# Altium footprint library Cty1.PcbLib: 1378 footprints (part 42 of 87)
Each footprint in its own frame and in the unit in brackets; x right, y up, seen from the top. Pads: shape width x height; smd on the part's side, far side on the other; paste and mask are expansions set on the pad; w line width, h text height; cw(c..) or ccw(c..) is an arc to the next point about the centre after c.
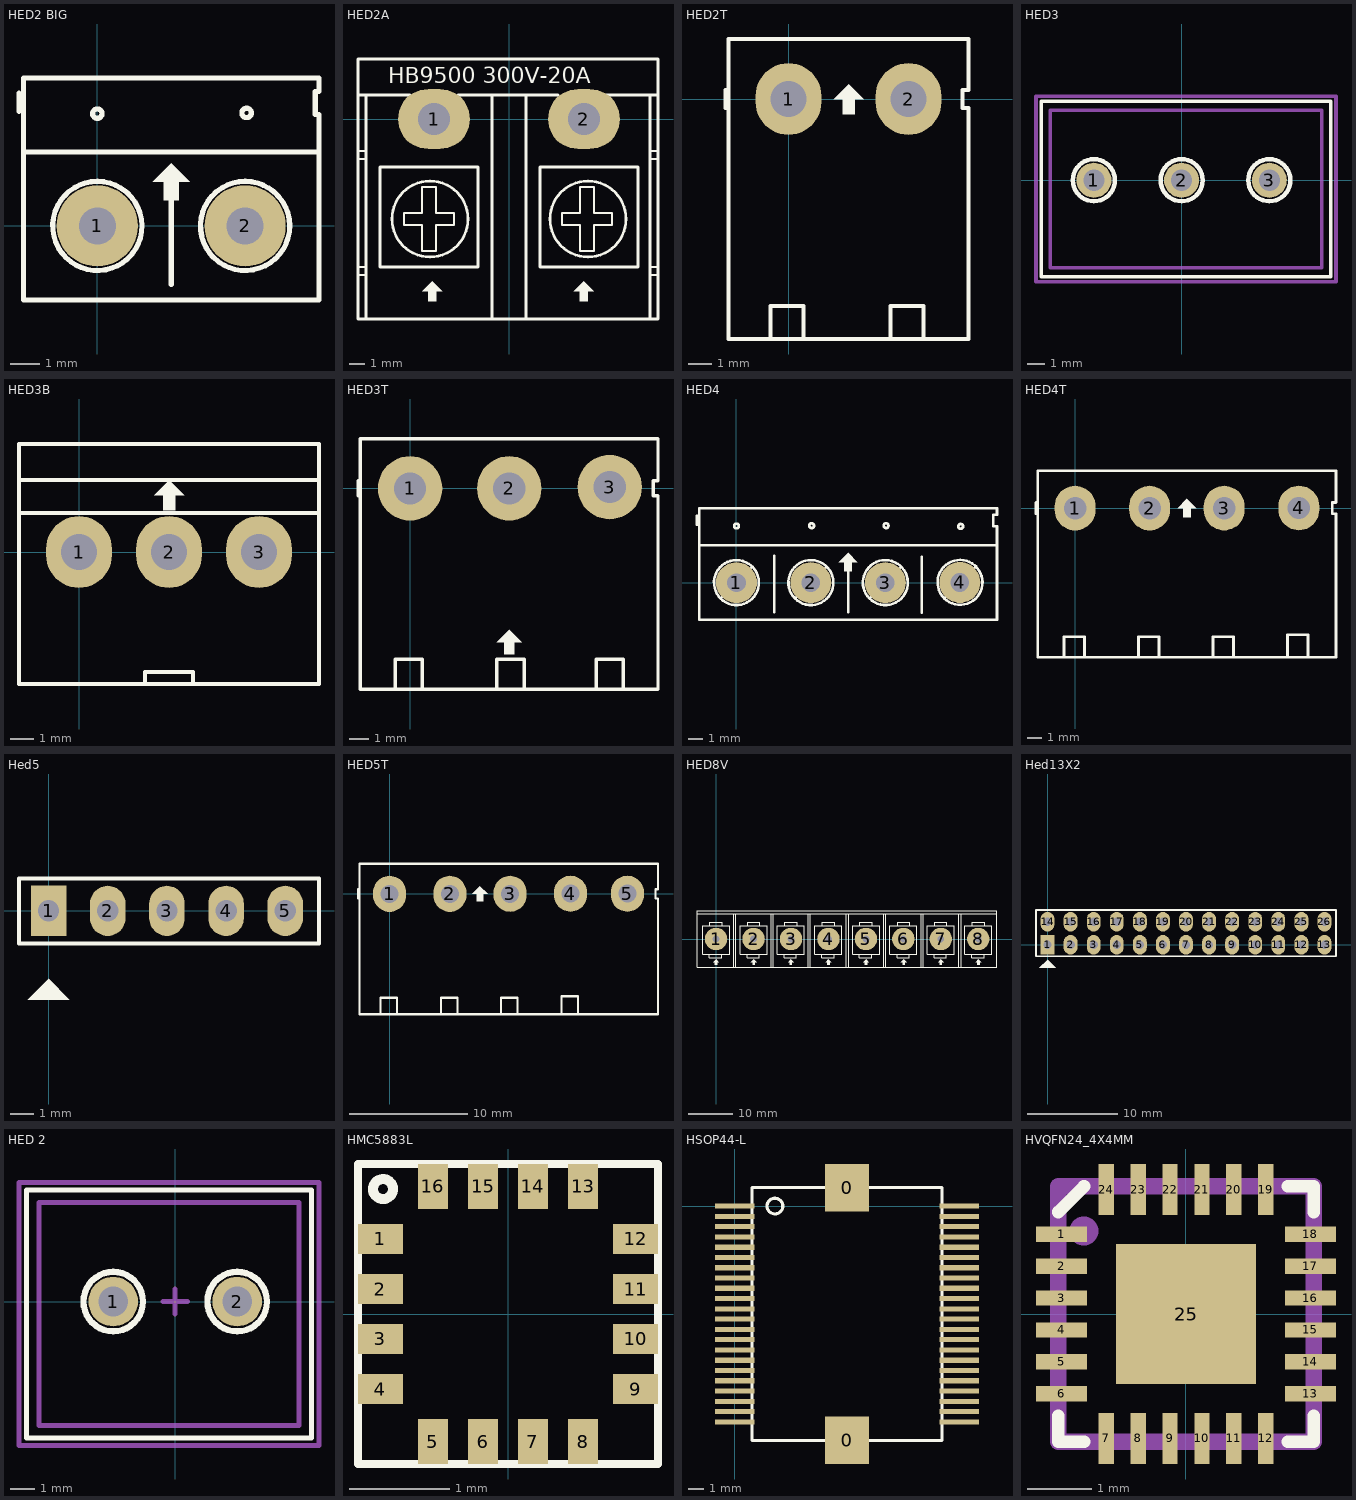
[diagram p41: the footprints below, top view; thin cyan lines are the x and y axes]

## HED2 BIG [mil] "Header 2, 2 pin, hight 300mil, Pin to Pin 200, Colour Green"
height 300
pads (2):
  round 110 hole 50: 1(0,0) 2(200,0)
Top Overlay:
  circle w7: c0,152 r6.4
  circle w7: c202,153 r6.4
  region: 100,85 75,60 90,60 90,35 110,35 110,60 125,60
  lines w7: -106,155 -106,180 ; -98,100 299,100 ; 38.83,46.23 ccw(c0,0) 40.11,45.12 ; 100,-79 100,72 ; 238.74,46.3 ccw(c200,0) 240.11,45.12 ; -100,-100 300,-100 300,151 295,151 295,182 300,182 300,200 -100,200 -100,50 -100,-100
3D body "SW3dPS-KRM2.STEP": height 393.7, standoff -157.48, extent -91.85,-140 301.85,155.28

## HED2A [mil] "Header 2: 300V-20A, 2 pin, hight 300mil, Pin to Pin 400, Colour Green"
height 300
pads (2):
  oval 180x150 hole 80: 1(-187.5,0) 2(187.5,0)
Top Overlay:
  circle w7: c197.5,-250 r95
  circle w7: c-197.5,-250 r95
  region: 187.5,-405 162.5,-430 177.5,-430 177.5,-455 197.5,-455 197.5,-430 212.5,-430
  region: -192.5,-405 -217.5,-430 -202.5,-430 -202.5,-455 -182.5,-455 -182.5,-430 -167.5,-430
  lines w5: -375,-390 -360,-390 ; -375,-370 -360,-370 ; -375,-100 -360,-100 ; -375,-80 -360,-80 ; 355,-390 370,-390 ; 355,-370 370,-370 ; 355,-100 370,-100 ; 355,-80 370,-80 ; -262.5,-265 -217.5,-265 -217.5,-330 -182.5,-330 -182.5,-265 -137.5,-265 -137.5,-235 -182.5,-235 -182.5,-170 -217.5,-170 -217.5,-235 -262.5,-235 -262.5,-265 ; 132.5,-265 132.5,-235 177.5,-235 177.5,-170 212.5,-170 212.5,-235 257.5,-235 257.5,-265 212.5,-265 212.5,-330 177.5,-330 177.5,-265 132.5,-265
  lines w7: -377.5,60 -247.5,60 ; -357.5,-495 -357.5,60 ; -127.5,60 122.5,60 ; -42.5,-495 -42.5,60 ; 42.5,-495 42.5,60 ; 242.5,60 372.5,60 ; 352.5,-495 352.5,60 ; -377.5,-500 372.5,-500 372.5,150 -377.5,150 -377.5,-500 ; -322.5,-370 -322.5,-120 -77.5,-120 -77.5,-370 -322.5,-370 ; 77.5,-370 322.5,-370 322.5,-120 77.5,-120 77.5,-370
  text "HB9500 300V-20A" at -302.5,90 h40

## HED2T [mil] "Header 2, 2 pin, hight 300mil, Pin to Pin 200, Colour Green"
height 300
pads (2):
  oval 110x120 hole 60: 1(0,0) 2(200,0)
Top Overlay:
  region: 100,25 75,0 90,0 90,-25 110,-25 110,0 125,0
  lines w7: -105,-15 -105,15 ; -100,100 -100,-400 300,-400 300,-15 290,-15 290,15 300,15 300,100 -98,100 ; -30,-400 -30,-345 25,-345 25,-400 ; 170,-400 170,-345 225,-345 225,-400
3D body "SW3dPS-5EHDR_2P.STEP": height 366.97, standoff -124.02, extent -96.7,-399.22 297,73.22

## HED3 [mm]
pads (3):
  round 2 hole 1.2 mask+0.01: 1(-5,0) 2(0,0) 3(5,0)
Top Overlay:
  circle w0.254: c-5,0 r1.2
  circle w0.254: c0,0 r1.2
  circle w0.254: c5,0 r1.2
  lines w0.2: -8,-5.5 8.5,-5.5 8.5,4.5 -8,4.5 -8,-5.5
Mechanical 13:
  lines w0.2: -7.5,-5 -7.5,4 8,4 8,-5 -7.5,-5
Mechanical 15:
  lines w0.2: -0.5,0 0.5,0 ; 0,-0.5 0,0.5 ; -8.3,-5.8 -8.3,4.8 8.8,4.8 8.8,-5.8 -8.3,-5.8
3D body "Klemmnik 300-031-12.STEP": height 12.5, standoff -4.5, extent -7.5,-5 8,4

## HED3B [mil] "Header 3, 3 pin, hight 300mil, Pin to Pin 150, Colour White"
height 300
pads (3):
  oval 110x120 hole 60: 1(0,0) 2(150,0) 3(300,0)
Top Overlay:
  region: 150,120 125,95 140,95 140,70 160,70 160,95 175,95
  lines w7: -100,65 400,65 ; -100,120 400,120 ; 110,-220 110,-200 190,-200 190,-220 ; -100,-220 400,-220 400,180 -100,180 -100,-220
3D body "User Library-1803280.STEP": height 285.43, standoff -133.86, extent -104.36,-221.14 400.36,145

## HED3T [mil] "Header 3, 3 pin, hight 300mil, Pin to Pin 200, Colour Green"
height 300
pads (3):
  round 130 hole 65: 1(0,0) 2(200,0) 3(402.62,2.62)
Top Overlay:
  region: 200,-285 175,-310 190,-310 190,-335 210,-335 210,-310 225,-310
  lines w7: -105,-15 -105,15 ; -30,-400 -30,-345 25,-345 25,-400 ; 175,-400 175,-345 230,-345 230,-400 ; 375,-400 375,-345 430,-345 430,-400 ; -100,-405 500,-405 500,-15 490,-15 490,15 500,15 500,100 -100,100 -100,-405
3D body "User Library-BigHeader 5EHDR_1P.step": height 90.55, standoff -400.44, extent -95,-404 101.85,68.44
3D body "User Library-BigHeader 5EHDR_1P.step": height 90.55, standoff -400.44, extent 102,-404 298.85,68.44
3D body "User Library-BigHeader 5EHDR_1P.step": height 90.55, standoff -400.44, extent 299,-404.22 495.85,68.22

## HED4 [mil] "Header 4, 4 pin, hight 300mil, Pin to Pin 200, Colour Green"
height 300
pads (4):
  round 110 hole 50: 1(0,0) 2(200,0) 3(400.06,0.06) 4(600.39,0.39)
Top Overlay:
  circle w7: c602.6,151 r6.4
  circle w7: c402,153 r6.4
  circle w7: c0,152 r6.4
  circle w7: c202,153 r6.4
  region: 300,80 275,55 290,55 290,30 310,30 310,55 325,55
  lines w7: -106,155 -106,180 ; -100,100 700,100 ; -42,-42 43,43 ; 39.04,46.05 ccw(c0,0) 45.18,40.05 ; 102,-79 102,72 ; 158,-42 242.5,42.5 ; 239.76,45.44 ccw(c200,0) 245.18,40.05 ; 300,-79 300,40 ; 358.5,-41.5 442.5,42.5 ; 439.27,45.97 ccw(c400.06,0.06) 445.19,40.17 ; 497.97,-81.03 497.97,69.97 ; 559,-41 643.5,43.5 ; 640.16,46.18 ccw(c600.59,0.59) 646.12,40.23 ; -100,-100 700,-100 700,151 690,151 690,182 700,182 700,200 -100,200 -100,50 -100,-100

## HED4T [mil] "Header 4, 4 pin, hight 300mil, Pin to Pin 200, Colour Green"
height 300
pads (4):
  oval 110x120 hole 60: 1(0,0) 2(200,0) 3(400.06,0.06) 4(600.39,0.39)
Top Overlay:
  region: 300,25 275,0 290,0 290,-25 310,-25 310,0 325,0
  lines w7: -105,-15 -105,15 ; -30,-400 -30,-345 25,-345 25,-400 ; 170,-400 170,-345 225,-345 225,-400 ; 370,-400 370,-345 425,-345 425,-400 ; 570,-395 570,-340 625,-340 625,-395 ; -100,-400 700,-400 700,-15 690,-15 690,15 700,15 700,100 -100,100 -100,-400
3D body "User Library-BigHeader 5EHDR_1P.step": height 90.55, standoff -400.44, extent 100,-406.22 296.85,66.22
3D body "User Library-BigHeader 5EHDR_1P.step": height 90.55, standoff -400.44, extent 500,-406.22 696.85,66.22
3D body "User Library-BigHeader 5EHDR_1P.step": height 90.55, standoff -400.44, extent 300,-406.22 496.85,66.22
3D body "User Library-BigHeader 5EHDR_1P.step": height 90.55, standoff -400.44, extent -100,-406.22 96.85,66.22

## Hed5 [mil] "Header 5, 5 pin, connecter 100mil"
height 300
pads (5):
  rect 60x85 hole 36: 1(0,0)
  oval 60x85 hole 36: 2(100,0) 3(200,0) 4(300,0) 5(400,0)
Top Overlay:
  region: 0,-115 -35,-150 35,-150
  lines w7: -50,-55 -50,55 457,55 457,-55 -50,-55

## HED5T [mil]
pads (5):
  oval 110x120 hole 60: 1(0,0) 2(200,0) 3(400.06,0.06) 4(600.39,0.39) 5(789.39,0.39)
Top Overlay:
  region: 300,25 275,0 290,0 290,-25 310,-25 310,0 325,0
  lines w7: -105,-15 -105,15 ; -30,-400 -30,-345 25,-345 25,-400 ; 170,-400 170,-345 225,-345 225,-400 ; 370,-400 370,-345 425,-345 425,-400 ; 570,-395 570,-340 625,-340 625,-395 ; -100,-400 -100,100 891,100 891,15 883,15 883,-15 891,-15 891,-400 -100,-400
3D body "User Library-BigHeader 5EHDR_1P.step": height 90.55, standoff -400.44, extent -93.85,-406 103,66.44
3D body "User Library-BigHeader 5EHDR_1P.step": height 90.55, standoff -400.44, extent 103.15,-406.22 300,66.22
3D body "User Library-BigHeader 5EHDR_1P.step": height 90.55, standoff -400.44, extent 497,-406.22 693.85,66.22
3D body "User Library-BigHeader 5EHDR_1P.step": height 90.55, standoff -400.44, extent 300,-406.22 496.85,66.22
3D body "User Library-BigHeader 5EHDR_1P.step": height 90.55, standoff -400.44, extent 694,-406.22 890.85,66.22

## HED8V [mil] "Header 6"
height 300
pads (8):
  round 200 hole 60: 1(0,0) 2(333.33,0) 3(666.67,0) 4(1000,0) 5(1333.33,0) 6(1666.67,0) 7(2000,0) 8(2333.33,0)
Top Overlay:
  drawing of 107 lines, arcs and shapes, not listed

## Hed13X2 [mil] "Header 13x2,26 pin, connecter"
pads (26):
  rect 60x85 hole 36: 1(0,0)
  oval 60x85 hole 36: 2(100,0) 3(200,0) 4(300,0) 5(400,0) 6(500,0) 7(600,0) 8(700,0) 9(800,0) 10(900,0) 11(1000,0) 12(1100,0) 13(1200,0) 14(0,100) 15(100,100) 16(200,100) 17(300,100) 18(400,100) 19(500,100) 20(600,100) 21(700,100) 22(800,100) 23(900,100) 24(1000,100) 25(1100,100) 26(1200,100)
Top Overlay:
  region: 0,-65 -35,-100 35,-100
  lines w8: -50,-50 1250,-50 1250,150 -50,150 -50,-50

## HED 2 [mm]
pads (2):
  round 2 hole 1.2 mask+0.01: 1(-2.5,0) 2(2.5,0)
Top Overlay:
  circle w0.254: c-2.5,0 r1.2
  circle w0.254: c2.5,0 r1.2
  lines w0.2: -6,-5.5 -6,4.5 5.5,4.5 5.5,-5.5 -6,-5.5
Mechanical 13:
  lines w0.2: -5.5,-5 5,-5 5,4 -5.5,4 -5.5,-5
Mechanical 15:
  lines w0.2: -0.5,0 0.5,0 ; 0,-0.5 0,0.5 ; -6.3,-5.8 5.8,-5.8 5.8,4.8 -6.3,4.8 -6.3,-5.8
3D body "Klemmnik 300-021-12.STEP": height 13.5, standoff -3.5, extent -5.5,-5 5,4

## HMC5883L [mm]
pads (16):
  rect 0.45x0.3 smd: 1(-1.275,0.75) 2(-1.275,0.25) 3(-1.275,-0.25) 4(-1.275,-0.75) 9(1.275,-0.75) 10(1.275,-0.25) 11(1.275,0.25) 12(1.275,0.75)
  rect 0.3x0.45 smd: 5(-0.75,-1.275) 6(-0.25,-1.275) 7(0.25,-1.275) 8(0.75,-1.275) 13(0.75,1.275) 14(0.25,1.275) 15(-0.25,1.275) 16(-0.75,1.275)
Top Overlay:
  lines w0.08: -1.5,-1.5 -1.5,1.5 1.5,1.5 1.5,-1.5 -1.5,-1.5
  lines w0.1: -1.153,1.274 ccw(c-1.25,1.25) -1.152,1.268
3D body "Part1.STEP": height 0.91, standoff 0, extent -1.55,-1.55 1.55,1.55

## HSOP44-L [mm]
pads (46):
  rect 2.8x3 smd: 0(7.1,-14.815) 0(7.1,1.162)
  rect 2.5x0.325 smd: 1(0,0) 2(0,-0.65) 3(0,-1.3) 4(0,-1.95) 5(0,-2.6) 6(0,-3.25) 7(0,-3.9) 8(0,-4.55) 9(0,-5.2) 10(0,-5.85) 11(0,-6.5) 12(0,-7.15) 13(0,-7.8) 14(0,-8.45) 15(0,-9.1) 16(0,-9.75) 17(0,-10.4) 18(0,-11.05) 19(0,-11.7) 20(0,-12.35) 21(0,-13) 22(0,-13.65) 23(14.2,-13.65) 24(14.2,-13) 25(14.2,-12.35) 26(14.2,-11.7) 27(14.2,-11.05) 28(14.2,-10.4) 29(14.2,-9.75) 30(14.2,-9.1) 31(14.2,-8.45) 32(14.2,-7.8) 33(14.2,-7.15) 34(14.2,-6.5) 35(14.2,-5.85) 36(14.2,-5.2) 37(14.2,-4.55) 38(14.2,-3.9) 39(14.2,-3.25) 40(14.2,-2.6) 41(14.2,-1.95) 42(14.2,-1.3) 43(14.2,-0.65) 44(14.2,0)
Top Overlay:
  circle w0.2: c2.54,0 r0.5
  lines w0.2: 1.1,-14.825 1.1,1.175 13.1,1.175 13.1,-14.825 1.1,-14.825

## HVQFN24_4X4MM [mm]
pads (25):
  rect 0.8x0.24 smd mask+0.025: 1(-1.95,1.25) 2(-1.95,0.75) 3(-1.95,0.25) 4(-1.95,-0.25) 5(-1.95,-0.75) 6(-1.95,-1.25) 13(1.95,-1.25) 14(1.95,-0.75) 15(1.95,-0.25) 16(1.95,0.25) 17(1.95,0.75) 18(1.95,1.25)
  rect 0.24x0.8 smd mask+0.025: 7(-1.25,-1.95) 8(-0.75,-1.95) 9(-0.25,-1.95) 10(0.25,-1.95) 11(0.75,-1.95) 12(1.25,-1.95) 19(1.25,1.95) 20(0.75,1.95) 21(0.25,1.95) 22(-0.25,1.95) 23(-0.75,1.95) 24(-1.25,1.95)
  rect 2.2x2.2 smd mask+0.025: 25(0,0)
Top Overlay:
  lines w0.2: -2,-1.6 -2,-2 -1.6,-2 ; -2,1.6 -1.6,2 ; 1.6,-2 2,-2 2,-1.6 ; 1.6,2 2,2 2,1.6
Mechanical 16:
  circle w0.254: c-1.6,1.3 r0.1
  lines w0.254: -2,-2 2,-2 2,2 -2,2 -2,-2
Mechanical 29:
  text ".Designator" at -0.2,0.7 h0.6
3D body: height 1, standoff 0, extent -2,-2 2,2